# Altium integrated library WE-RJ45_LAN_rev16b.intlib: 51 symbols (continued)
## 7499110123 (continued)
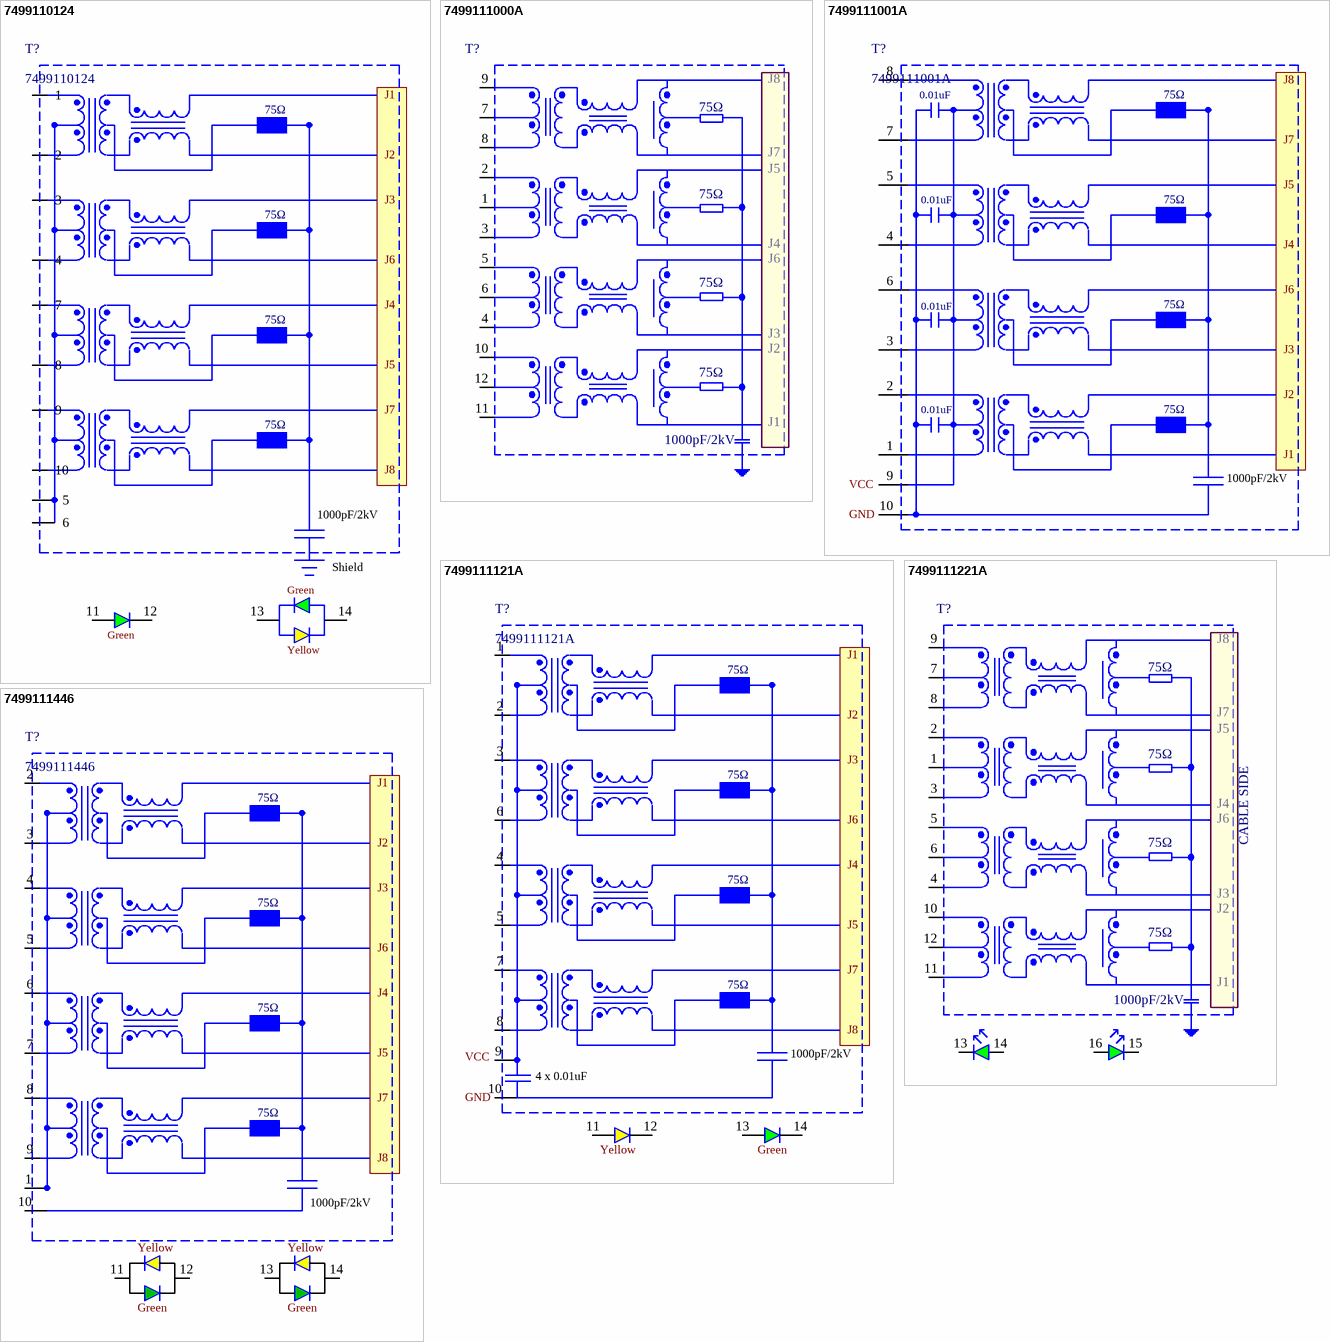
[diagram p4: symbols 7499110124 to 7499111446]
text: 1 CT:1 CT; J1; 75Ω; J2; J3; J6; J4; J5; J7; J8; 0.1 uF; 1000pF/2kV; Shield; Green; Yellow

## 7499110124
designator T?
RJ45 LAN Transformer, 10/100/1000 Base-T; Manufacturer: Wurth Elektronik; ComponentLink1 Description: Manufacturer; ComponentLink2 Description: Datasheet; ComponentLink1 URL: http://www.we-online.com; ComponentLink2 URL: http://katalog.we-online.de/pbs/datasheet/7499110124.pdf; Created By: Baojun Chen; Created Date: 14-Aug-15; PartNo: 7499110124
footprint 7499110124 (RJ45 LAN Transformer, 10/100/1000 Base-T)
pins: 1, 2, 3, 4, 5, 6, 7, 8, 9, 10, 11, 12, 13, 14
text: J1; 75Ω; J2; J3; J6; J4; J5; J7; J8; 1000pF/2kV; Shield; Green; Yellow

## 7499111000A
designator T?  (value not drawn)
RJ45 LAN Transformer, 10/100/1000 Base-T; Manufacturer: Wurth Elektronik; PartNo: 7499111000A; ComponentLink1Description: Manufacturer; ComponentLink1URL: http://www.we-online.de; Created by: Baojun Chen; Created Date: 14.Aug.2015; ComponentLink2Description: Datasheet; ComponentLink2URL: http://katalog.we-online.de/pbs/datasheet/7499111000A.pdf
footprint 7499111000A (RJ45 LAN Transformer, 10/100/1000 Base-T)
pins: 1, 2, 3, 4, 5, 6, 7, 8, 9, 10, 11, 12
text: J8; 75Ω; J7; J5; J4; J6; J3; J2; J1; 1000pF/2kV

## 7499111001A
designator T?
RJ45 LAN Transformer, 10/100/1000 Base-T; Manufacturer: Wurth Elektronik; ComponentLink1 Description: Manufacturer; ComponentLink2 Description: Datasheet; ComponentLink1 URL: http://www.we-online.com; ComponentLink2 URL: http://katalog.we-online.de/pbs/datasheet/7499111001A.pdf; Created By: Baojun Chen; Created Date: 15-Aug-15; PartNo: 7499111001A
footprint 7499111001A (RJ45 LAN Transformer, 10/100/1000 Base-T)
pins: 1, 2, 3, 4, 5, 6, 7, 8, 9, 10
text: J8; 0.01uF; 75Ω; J7; J5; J4; J6; J3; J2; J1; 1000pF/2kV; VCC; GND

## 7499111121A
designator T?
RJ45 LAN Transformer, 10/100/1000 Base-T; Manufacturer: Wurth Elektronik; ComponentLink1 Description: Manufacturer; ComponentLink2 Description: Datasheet; ComponentLink1 URL: http://www.we-online.com; ComponentLink2 URL: http://katalog.we-online.de/pbs/datasheet/7499111121A.pdf; Created By: Baojun Chen; Created Date: 14-Aug-15; PartNo: 7499111121A
footprint 7499111121A (RJ45 LAN Transformer, 10/100/1000 Base-T)
pins: 1, 2, 3, 4, 5, 6, 7, 8, 9, 10, 11, 12, 13, 14
text: J1; 75Ω; J2; J3; J6; J4; J5; J7; J8; 1000pF/2kV; VCC; 4 x 0.01uF; GND; Yellow; Green

## 7499111221A
designator T?
RJ45 LAN Transformer, 10/100/1000 Base-T; PartNo: 7499111221A; Manufacturer: Wurth Elektronik; E-mail: libraries@we-online.com; ComponentLink1Description: Manufacturer; ComponentLink1URL: http://www.we-online.de; Created by: Karrer Zheng; Created Date: May 2015; ComponentLink2Description: Datasheet; ComponentLink2URL: http://www.we-online.de/katalog/media/pdf/7499111221A.pdf
footprint 7499111221A
pins: 1, 2, 3, 4, 5, 6, 7, 8, 9, 10, 11, 12, 13 K, 14 A, 15 K, 16 A
text: J8; 75Ω; J7; J5; J4; J6; CABLE SIDE; J3; J2; J1; 1000pF/2kV

## 7499111446
designator T?
RJ45 LAN Transformer, 10/100/1000 Base-T; Manufacturer: Wurth Elektronik; ComponentLink1 Description: Manufacturer; ComponentLink2 Description: Datasheet; ComponentLink1 URL: http://www.we-online.com; ComponentLink2 URL: http://katalog.we-online.de/pbs/datasheet/7499111446.pdf; Created By: Baojun Chen; Created Date: 14-Aug-15; PartNo: 7499111446
footprint 7499111446 (RJ45 LAN Transformer, 10/100/1000 Base-T)
pins: 1, 2, 3, 4, 5, 6, 7, 8, 9, 10, 11, 12, 13, 14
text: J1; 75Ω; J2; J3; J6; J4; J5; J7; J8; 1000pF/2kV; Yellow; Green

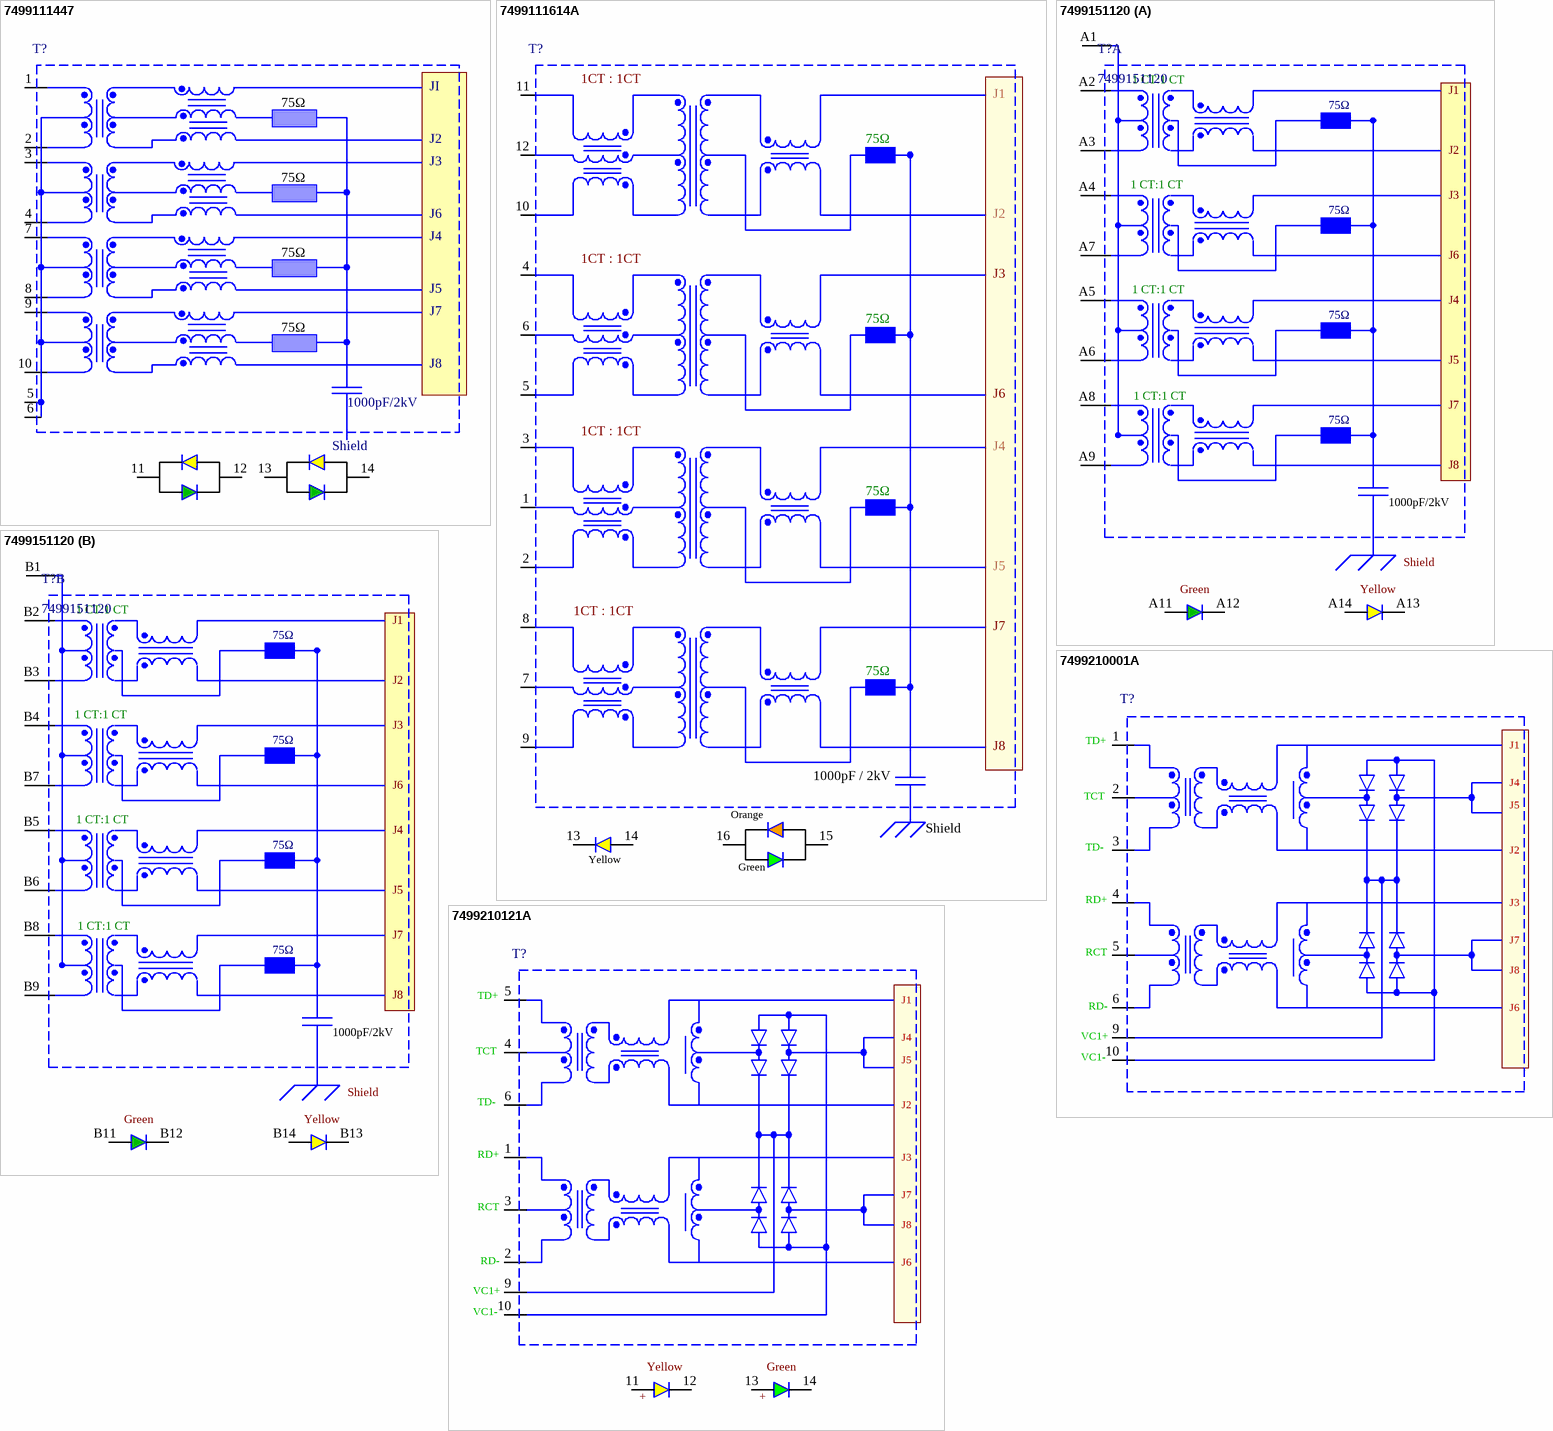
[diagram p5: symbols 7499111447 to 7499210121A]

## 7499111447
designator T?  (value not drawn)
RJ45 LAN Transformer, 10/100/1000 Base-T; Manufacturer: Wurth Elektronik; PartNo: 7499111447; ComponentLink1Description: Manufacturer; ComponentLink1URL: http://www.we-online.de; Created by: Baojun Chen; Created Date: Aug. 2015; ComponentLink2Description: Datasheet; ComponentLink2URL: http://katalog.we-online.de/pbs/datasheet/7499111447.pdf
footprint 7499111447 (RJ45 LAN Transformer 10/100/1000 Base-T)
pins: 1, 2, 3, 4, 5, 6, 7, 8, 9, 10, 11, 12, 13, 14
text: JI; 75Ω; J2; J3; J6; J4; J5; J7; J8; 1000pF/2kV; Shield

## 7499111614A
designator T?  (value not drawn)
RJ45 LAN Transformer, 10/100/1000 Base-T High Performance Low EMI; Manufacturer: Wurth Elektronik; PartNo: 7499111614A; ComponentLink1Description: Manufacturer; ComponentLink1URL: http://www.we-online.de; Created by: Baojun Chen; Created Date: 15.Aug.2015; ComponentLink2Description: Datasheet; ComponentLink2URL: http://katalog.we-online.de/pbs/datasheet/7499111614A.pdf
footprint 7499111614A (RJ45 LAN Transformer, 10/100/1000 Base-T High Performance Low EMI)
pins: 1, 2, 3, 4, 5, 6, 7, 8, 9, 10, 11, 12, 13, 14, 15, 16
text: 1CT : 1CT; J1; 75Ω; J2; J3; J6; J4; J5; J7; J8; 1000pF / 2kV; Orange; Shield; Yellow; Green

## 7499151120
designator T?
RJ45 LAN Transformer, 10/100/1000 Base-T Multiport & USB; Manufacturer: Wurth Elektronik; ComponentLink1 Description: Manufacturer; ComponentLink2 Description: Datasheet; ComponentLink1 URL: http://www.we-online.com; ComponentLink2 URL: http://katalog.we-online.de/pbs/datasheet/7499151120.pdf; Created By: Baojun Chen; Created Date: 18-Aug-15; PartNo: 7499151120
footprint 7499151120 (RJ45 LAN Transformer, 10/100/1000 Base-T Multiport & USB)
part A pins: A1, A2, A3, A4, A5, A6, A7, A8, A9, A11, A12, A13, A14
part B pins: B1, B2, B3, B4, B5, B6, B7, B8, B9, B11, B12, B13, B14
1 alternate drawing of the same symbol
part A text: 1 CT:1 CT; J1; 75Ω; J2; J3; J6; J4; J5; J7; J8; 1000pF/2kV; Shield; Green; Yellow
part B text: 1 CT:1 CT; J1; 75Ω; J2; J3; J6; J4; J5; J7; J8; 1000pF/2kV; Shield; Green; Yellow

## 7499210001A
designator T?  (value not drawn)
RJ45 LAN Transformer, 10/100/1000 Base-T PoE/PoE+; Manufacturer: Wurth Elektronik; PartNo: 7499210001A; ComponentLink1Description: Manufacturer; ComponentLink1URL: http://www.we-online.de; Created by: Baojun Chen; Created Date: 17.Aug.2015; ComponentLink2Description: Datasheet; ComponentLink2URL: http://katalog.we-online.de/pbs/datasheet/7499210001A.pdf
footprint 7499210001A (RJ45 LAN Transformer, 10/100/1000 Base-T PoE/PoE+)
pins: 1 TD+, 2 TCT, 3 TD-, 4 RD+, 5 RCT, 6 RD-, 9 VC1+, 10 VC1-
text: J1; J4; J5; J2; J3; J7; J8; J6

## 7499210121A
designator T?  (value not drawn)
RJ45 LAN Transformer, 10/100/1000 Base-T PoE/PoE+; Manufacturer: Wurth Elektronik; PartNo: 7499210121A; ComponentLink1Description: Manufacturer; ComponentLink1URL: http://www.we-online.de; Created by: Baojun Chen; Created Date: 17.Aug.2015; ComponentLink2Description: Datasheet; ComponentLink2URL: http://katalog.we-online.de/pbs/datasheet/7499210121A.pdf
footprint 7499210121A (RJ45 LAN Transformer, 10/100/1000 Base-T PoE/PoE+)
pins: 1 RD+, 2 RD-, 3 RCT, 4 TCT, 5 TD+, 6 TD-, 9 VC1+, 10 VC1-, 11, 12, 13, 14
text: J1; J4; J5; J2; J3; J7; J8; J6; Yellow; Green; +

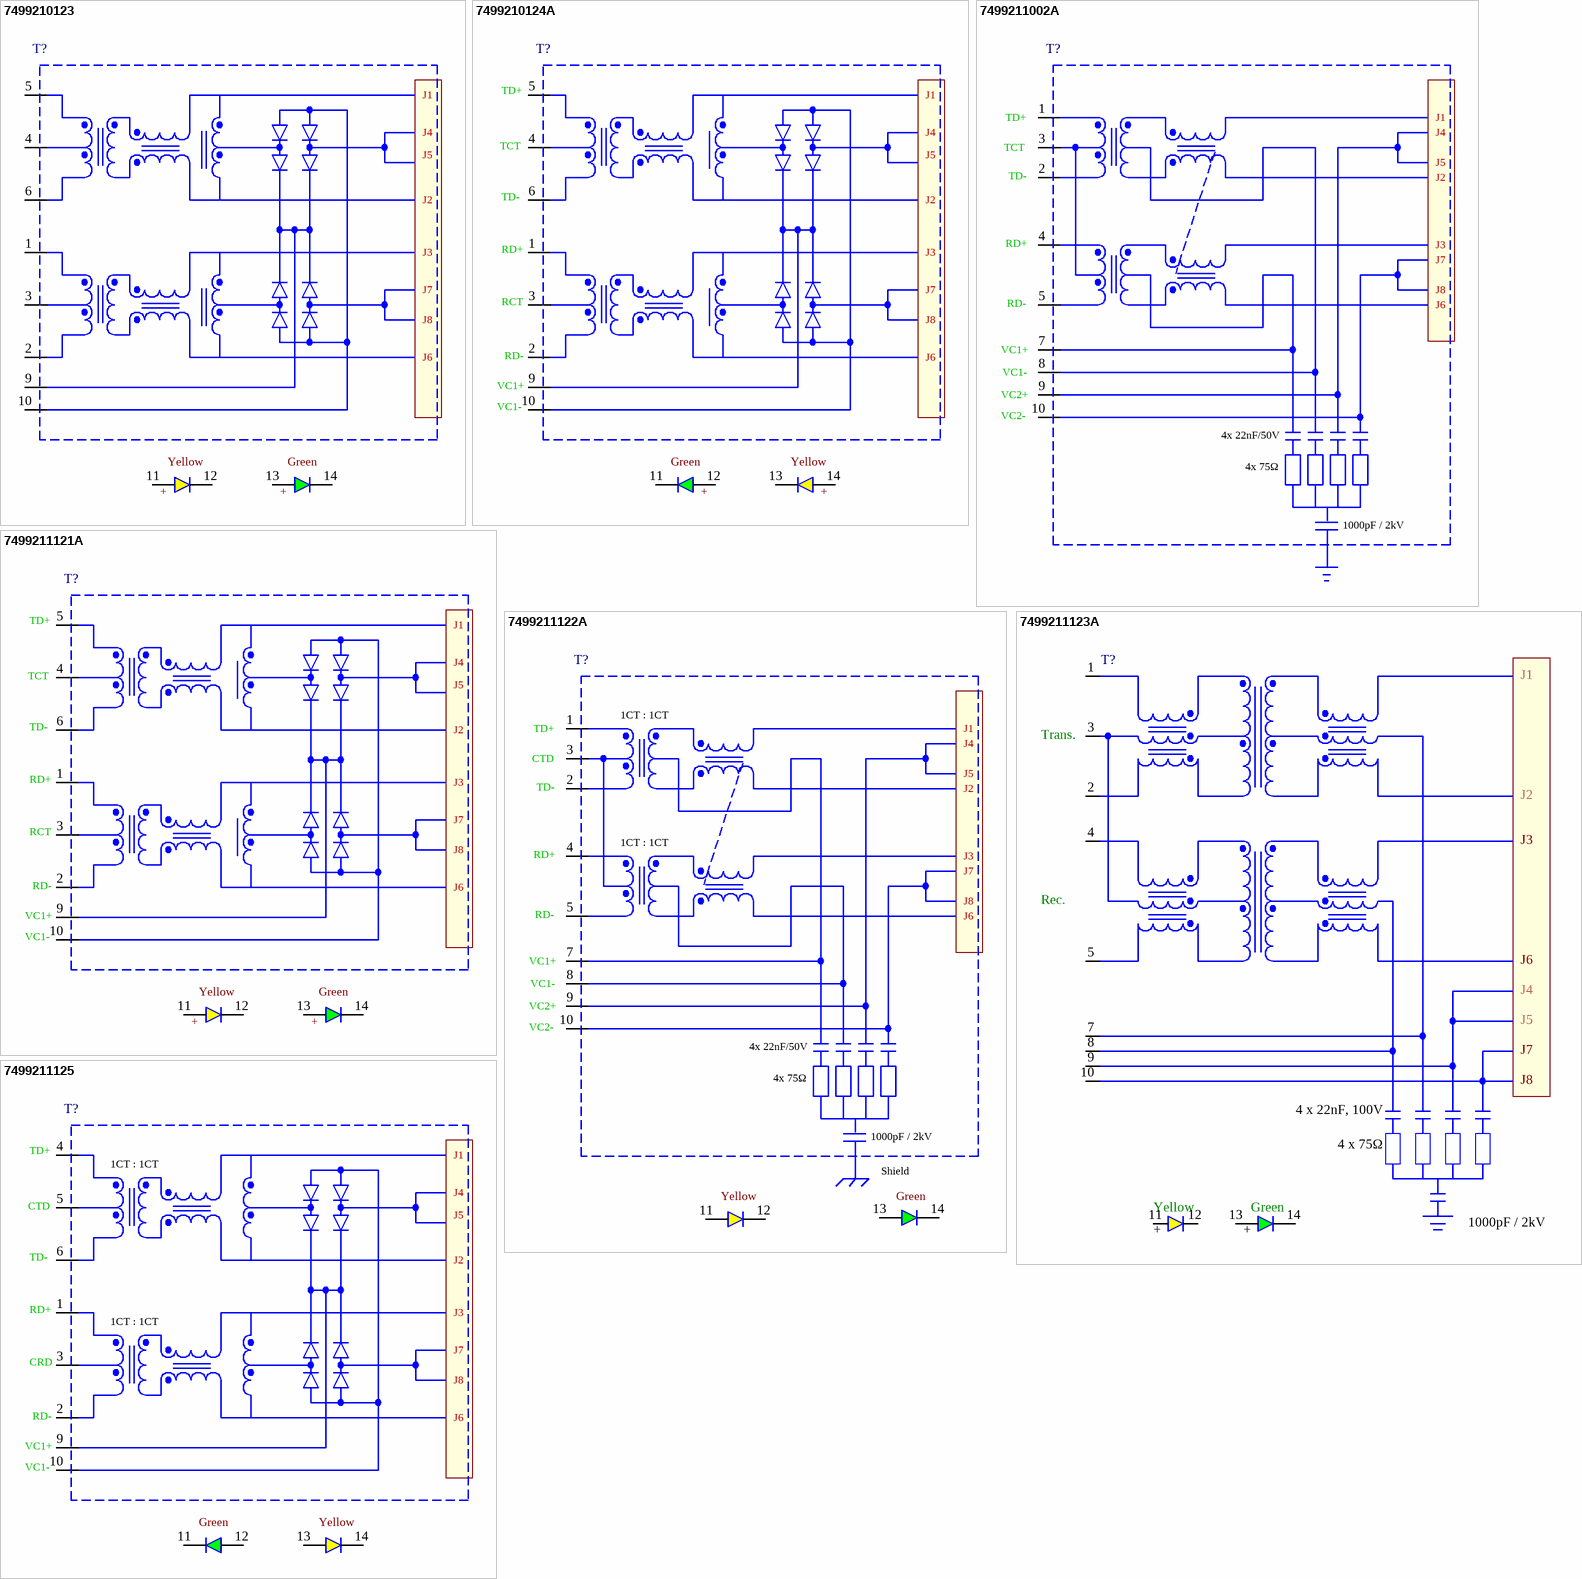
[diagram p6: symbols 7499210123 to 7499211125]

## 7499210123
designator T?  (value not drawn)
RJ45 LAN Transformer, 10/100/1000 Base-T PoE/PoE+; Manufacturer: Wurth Elektronik; PartNo: 7499210123; ComponentLink1Description: Manufacturer; ComponentLink1URL: http://www.we-online.de; Created by: Baojun Chen; Created Date: 17.Aug.2015; ComponentLink2Description: Datasheet; ComponentLink2URL: http://katalog.we-online.de/pbs/datasheet/7499210123.pdf
footprint 7499210123 (RJ45 LAN Transformer, 10/100/1000 Base-T PoE/PoE+)
pins: 1, 2, 3, 4, 5, 6, 9, 10, 11, 12, 13, 14
text: J1; J4; J5; J2; J3; J7; J8; J6; Yellow; Green; +

## 7499210124A
designator T?  (value not drawn)
RJ45 LAN Transformer, 10/100/1000 Base-T PoE/PoE+; Manufacturer: Wurth Elektronik; PartNo: 7499210124A; ComponentLink1Description: Manufacturer; ComponentLink1URL: http://www.we-online.de; Created by: Baojun Chen; Created Date: 17.Aug.2015; ComponentLink2Description: Datasheet; ComponentLink2URL: http://katalog.we-online.de/pbs/datasheet/7499210124A.pdf
footprint 7499210124A (RJ45 LAN Transformer, 10/100/1000 Base-T PoE/PoE+)
pins: 1 RD+, 2 RD-, 3 RCT, 4 TCT, 5 TD+, 6 TD-, 9 VC1+, 10 VC1-, 11, 12, 13, 14
text: J1; J4; J5; J2; J3; J7; J8; J6; Green; Yellow; +

## 7499211002A
designator T?  (value not drawn)
RJ45 LAN Transformer, 10/100/1000 Base-T PoE/PoE+; Manufacturer: Wurth Elektronik; PartNo: 7499211002A; ComponentLink1Description: Manufacturer; ComponentLink1URL: http://www.we-online.de; Created by: Baojun Chen; Created Date: 17.Aug.2015; ComponentLink2Description: Datasheet; ComponentLink2URL: http://katalog.we-online.de/pbs/datasheet/7499211002A.pdf
footprint 7499211002A (RJ45 LAN Transformer, 10/100/1000 Base-T PoE/PoE+)
pins: 1 TD+, 2 TD-, 3 TCT, 4 RD+, 5 RD-, 7 VC1-, 8 VC1-, 9 VC2+, 10 VC2-
text: J1; J4; J5; J2; J3; J7; J8; J6; VC1+; 4x 22nF/50V; 4x 75Ω; 1000pF / 2kV

## 7499211121A
designator T?  (value not drawn)
RJ45 LAN Transformer, 10/100/1000 Base-T PoE/PoE+; Manufacturer: Wurth Elektronik; PartNo: 7499211121A; ComponentLink1Description: Manufacturer; ComponentLink1URL: http://www.we-online.de; Created by: Baojun Chen; Created Date: 17.Aug.2015; ComponentLink2Description: Datasheet; ComponentLink2URL: http://katalog.we-online.de/pbs/datasheet/7499211121A.pdf
footprint 7499211121A (RJ45 LAN Transformer, 10/100/1000 Base-T PoE/PoE+)
pins: 1 RD+, 2 RD-, 3 RCT, 4 TCT, 5 TD+, 6 TD-, 9 VC1+, 10 VC1-, 11, 12, 13, 14
text: J1; J4; J5; J2; J3; J7; J8; J6; Yellow; Green; +

## 7499211122A
designator T?  (value not drawn)
RJ45 LAN Transformer, 10/100/1000 Base-T PoE/PoE+; Manufacturer: Wurth Elektronik; PartNo: 7499211122A; ComponentLink1Description: Manufacturer; ComponentLink1URL: http://www.we-online.de; Created by: Baojun Chen; Created Date: 17.Aug.2015; ComponentLink2Description: Datasheet; ComponentLink2URL: http://katalog.we-online.de/pbs/datasheet/7499211122A.pdf
footprint 7499211122A (RJ45 LAN Transformer, 10/100/1000 Base-T PoE/PoE+)
pins: 1 TD+, 2 TD-, 3 CTD, 4 RD+, 5 RD-, 7 VC1-, 8 VC1-, 9 VC2+, 10 VC2-, 11, 12, 13, 14
text: 1CT : 1CT; J1; J4; J5; J2; J3; J7; J8; J6; VC1+; 4x 22nF/50V; 4x 75Ω; 1000pF / 2kV; Shield; Yellow; Green

## 7499211123A
designator T?  (value not drawn)
RJ45 LAN Transformer, 10/100/1000 Base-T High Performance Low EMI; Manufacturer: Wurth Elektronik; PartNo: 7499211123A; ComponentLink1Description: Manufacturer; ComponentLink1URL: http://www.we-online.de; Created by: Baojun Chen; Created Date: 15.Aug.2015; ComponentLink2Description: Datasheet; ComponentLink2URL: http://katalog.we-online.de/pbs/datasheet/7499211123A.pdf
footprint 7499211123A (RJ45 LAN Transformer, 10/100/1000 Base-T High Performance Low EMI)
pins: 1, 2, 3, 4, 5, 7, 8, 9, 10, 11, 12, 13, 14
text: J1; Trans.; J2; J3; Rec.; J6; J4; J5; J7; J8; 4 x 22nF, 100V; 4 x 75Ω; Yellow; Green; 1000pF / 2kV; +

## 7499211125
designator T?  (value not drawn)
RJ45 LAN Transformer, 10/100/1000 Base-T PoE/PoE+; Manufacturer: Wurth Elektronik; PartNo: 7499211125; ComponentLink1Description: Manufacturer; ComponentLink1URL: http://www.we-online.de; Created by: Baojun Chen; Created Date: 17.Aug.2015; ComponentLink2Description: Datasheet; ComponentLink2URL: http://katalog.we-online.de/pbs/datasheet/7499211125.pdf
footprint 7499211125 (RJ45 LAN Transformer, 10/100/1000 Base-T PoE/PoE+)
pins: 1 RD+, 2 RD-, 3 CRD, 4 TD+, 5 CTD, 6 TD-, 9 VC1+, 10 VC1-, 11, 12, 13, 14
text: J1; 1CT : 1CT; J4; J5; J2; J3; J7; J8; J6; Green; Yellow

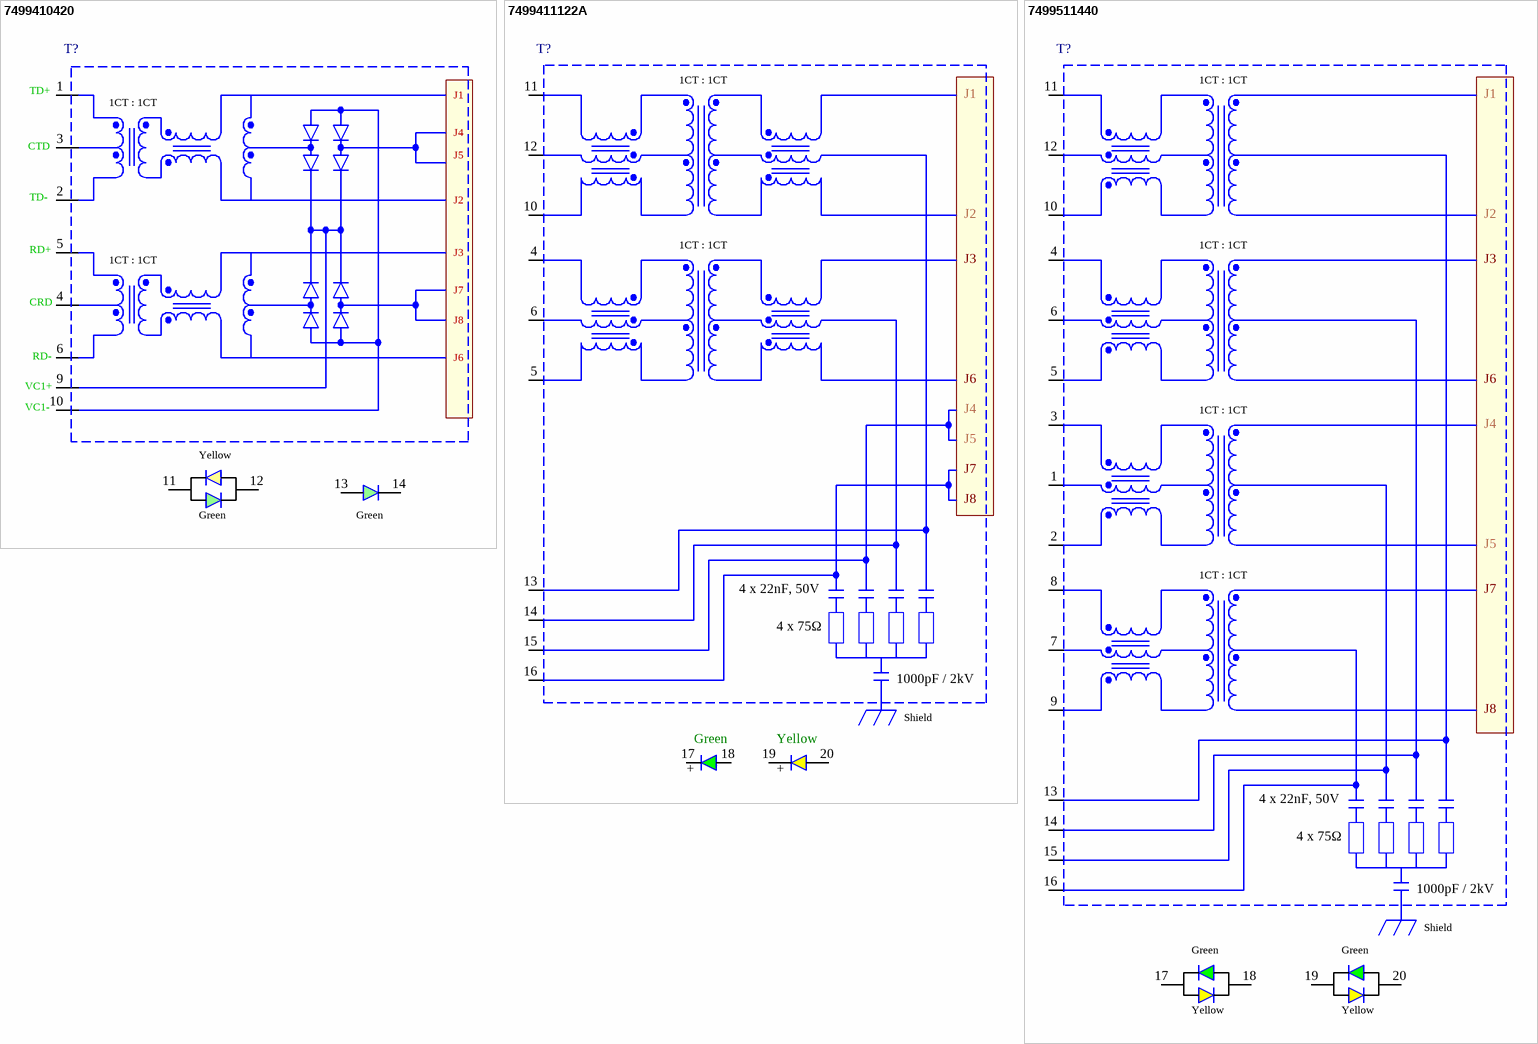
[diagram p7: symbols 7499410420 to 7499511440]

## 7499410420
designator T?  (value not drawn)
RJ45 LAN Transformer, 10/100/1000 Base-T PoE/PoE+; Manufacturer: Wurth Elektronik; PartNo: 7499410420; ComponentLink1Description: Manufacturer; ComponentLink1URL: http://www.we-online.de; Created by: Baojun Chen; Created Date: 17.Aug.2015; ComponentLink2Description: Datasheet; ComponentLink2URL: http://katalog.we-online.de/pbs/datasheet/7499410420.pdf
footprint 7499410420 (RJ45 LAN Transformer, 10/100/1000 Base-T PoE/PoE+)
pins: 1 TD+, 2 TD-, 3 CTD, 4 CRD, 5 RD+, 6 RD-, 9 VC1+, 10 VC1-, 11, 12, 13, 14
text: J1; 1CT : 1CT; J4; J5; J2; J3; J7; J8; J6; Yellow; Green

## 7499411122A
designator T?  (value not drawn)
RJ45 LAN Transformer, 10/100/1000 Base-T High Performance Low EMI; Manufacturer: Wurth Elektronik; PartNo: 7499411122A; ComponentLink1Description: Manufacturer; ComponentLink1URL: http://www.we-online.de; Created by: Baojun Chen; Created Date: 17.Aug.2015; ComponentLink2Description: Datasheet; ComponentLink2URL: http://katalog.we-online.de/pbs/datasheet/7499411122A.pdf
footprint 7499411122A (RJ45 LAN Transformer, 10/100/1000 Base-T High Performance Low EMI)
pins: 4, 5, 6, 10, 11, 12, 13, 14, 15, 16, 17, 18, 19, 20
text: 1CT : 1CT; J1; J2; J3; J6; J4; J5; J7; J8; 4 x 22nF, 50V; 4 x 75Ω; 1000pF / 2kV; Shield; Green; Yellow; +

## 7499511440
designator T?  (value not drawn)
RJ45 LAN Transformer, 10/100/1000 Base-T PoE/PoE+; Manufacturer: Wurth Elektronik; PartNo: 7499511440; ComponentLink1Description: Manufacturer; ComponentLink1URL: http://www.we-online.de; Created by: Baojun Chen; Created Date: 17.Aug.2015; ComponentLink2Description: Datasheet; ComponentLink2URL: http://katalog.we-online.de/pbs/datasheet/7499511440.pdf
footprint 7499511440 (RJ45 LAN Transformer, 10/100/1000 Base-T PoE/PoE+)
pins: 1, 2, 3, 4, 5, 6, 7, 8, 9, 10, 11, 12, 13, 14, 15, 16, 17, 18, 19, 20
text: 1CT : 1CT; J1; J2; J3; J6; J4; J5; J7; J8; 4 x 22nF, 50V; 4 x 75Ω; 1000pF / 2kV; Shield; Green; Yellow

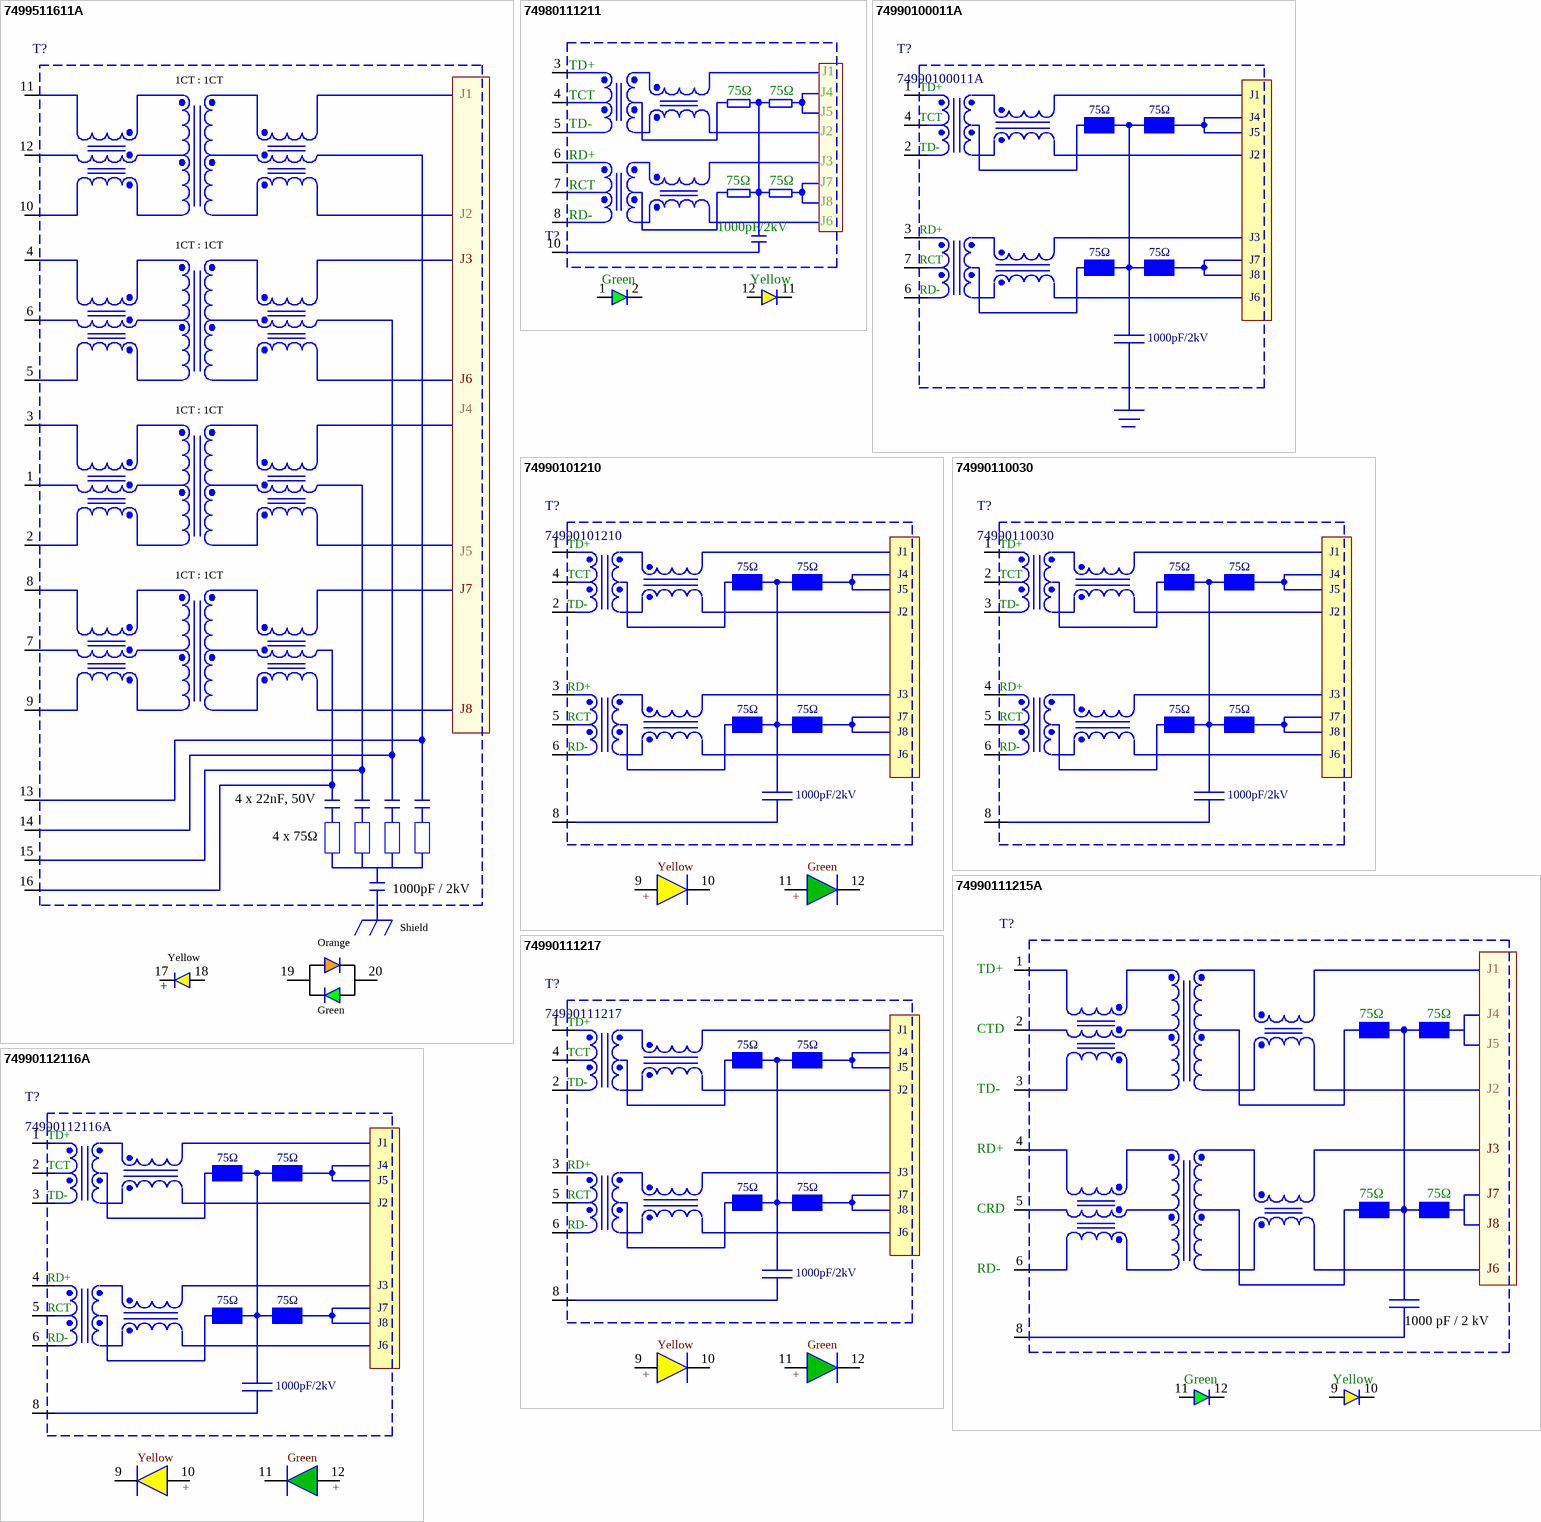
[diagram p8: symbols 7499511611A to 74990112116A]

## 7499511611A
designator T?  (value not drawn)
RJ45 LAN Transformer, 10/100/1000 Base-T High Performance Low EMI; Manufacturer: Wurth Elektronik; PartNo: 7499511611A; ComponentLink1Description: Manufacturer; ComponentLink1URL: http://www.we-online.de; Created by: Baojun Chen; Created Date: 17.Aug.2015; ComponentLink2Description: Datasheet; ComponentLink2URL: http://katalog.we-online.de/pbs/datasheet/7499511611A.pdf
footprint 7499511611A (RJ45 LAN Transformer, 10/100/1000 Base-T High Performance Low EMI)
pins: 1, 2, 3, 4, 5, 6, 7, 8, 9, 10, 11, 12, 13, 14, 15, 16, 17, 18, 19, 20
text: 1CT : 1CT; J1; J2; J3; J6; J4; J5; J7; J8; 4 x 22nF, 50V; 4 x 75Ω; 1000pF / 2kV; Shield; Orange; Yellow; +; Green

## 74980111211
designator T?
RJ45 LAN Transformer, 10/100/1000 Base-T SMD; PartNo: 74980111211; Manufacturer: Wurth Elektronik; E-mail: libraries@we-online.com; ComponentLink1Description: Manufacturer; ComponentLink1URL: http://www.we-online.de; Created by: Karrer Zheng; Created Date: Feb 2015; ComponentLink2Description: Datasheet; ComponentLink2URL: http://www.we-online.de/katalog/media/pdf/74980111211.pdf
footprint 74980111211 (10/100Base-T, SMD, 1x1, Tab up, with shield tabs, LED L-R yellow-green; ETR)
pins: 1 +, 2 -, 3 RD+, 4 RCT, 5 RD-, 6 TD+, 7 TCT, 8 TD-, 10 SH, 11 -, 12 +
text: J1; 75Ω; J4; J5; J2; J3; J7; J8; J6; 1000pF/2kV; Green; Yellow

## 74990100011A
designator T?
RJ45 LAN Transformer, 10/100 Base-T; Manufacturer: Wurth Elektronik; ComponentLink1 Description: Manufacturer; ComponentLink2 Description: Datasheet; ComponentLink1 URL: http://www.we-online.com; ComponentLink2 URL: http://katalog.we-online.de/pbs/datasheet/74990100011A.pdf; Created By: Baojun Chen; Created Date: 14-Aug-15; PartNo: 74990100011A
footprint 74990100011A (RJ45 LAN Transformer, 10/100 Base-T)
pins: 1 TD+, 2 TCT, 3 TD-, 4 RD+, 6 RD-, 7
text: J1; 75Ω; J4; J5; J2; J3; RCT; J7; J8; J6; 1000pF/2kV

## 74990101210
designator T?
RJ45 LAN Transformer, 10/100 Base-T; Manufacturer: Wurth Elektronik; ComponentLink1 Description: Manufacturer; ComponentLink2 Description: Datasheet; ComponentLink1 URL: http://www.we-online.com; ComponentLink2 URL: http://katalog.we-online.de/pbs/datasheet/74990101210.pdf; Created By: Baojun Chen; Created Date: 14-Aug-15; PartNo: 74990101210
footprint 74990101210 (RJ45 LAN Transformer, 10/100 Base-T)
pins: 1 TD+, 2 TCT, 3 TD-, 4 RD+, 5 RCT, 6 RD-, 8, 9, 10, 11, 12
text: J1; 75Ω; J4; J5; J2; J3; J7; J8; J6; 1000pF/2kV; Yellow; Green; +

## 74990110030
designator T?
RJ45 LAN Transformer, 10/100 Base-T; Manufacturer: Wurth Elektronik; ComponentLink1 Description: Manufacturer; ComponentLink2 Description: Datasheet; ComponentLink1 URL: http://www.we-online.com; ComponentLink2 URL: http://katalog.we-online.de/pbs/datasheet/74990110030.pdf; Created By: Baojun Chen; Created Date: 13-Aug-15; PartNo: 74990110030
footprint 74990110030 (RJ45 LAN Transformer, 10/100 Base-T)
pins: 1 TD+, 2 TCT, 3 TD-, 4 RD+, 5 RCT, 6 RD-, 8
text: J1; 75Ω; J4; J5; J2; J3; J7; J8; J6; 1000pF/2kV

## 74990111215A
designator T?  (value not drawn)
RJ45 LAN Transformer, 10/100/1000 Base-T High Performance Low EMI; Manufacturer: Wurth Elektronik; PartNo: 74990111215A; ComponentLink1Description: Manufacturer; ComponentLink1URL: http://www.we-online.de; Created by: Baojun Chen; Created Date: 15.Aug.2015; ComponentLink2Description: Datasheet; ComponentLink2URL: http://katalog.we-online.de/pbs/datasheet/74990111215A.pdf
footprint 74990111215A (RJ45 LAN Transformer, 10/100/1000 Base-T High Performance Low EMI)
pins: 1 TD+, 2 CTD, 3 TD-, 4 RD+, 5 CRD, 6 RD-, 8, 9, 10, 11, 12
text: J1; 75Ω; J4; J5; J2; J3; J7; J8; J6; 1000 pF / 2 kV; Green; Yellow

## 74990111217
designator T?
RJ45 LAN Transformer, 10/100 Base-T; Manufacturer: Wurth Elektronik; ComponentLink1 Description: Manufacturer; ComponentLink2 Description: Datasheet; ComponentLink1 URL: http://www.we-online.com; ComponentLink2 URL: http://katalog.we-online.de/pbs/datasheet/74990111217.pdf; Created By: Baojun Chen; Created Date: 14-Aug-15; PartNo: 74990111217
footprint 74990111217 (RJ45 LAN Transformer, 10/100 Base-T)
pins: 1 TD+, 2 TCT, 3 TD-, 4 RD+, 5 RCT, 6 RD-, 8, 9, 10, 11, 12
text: J1; 75Ω; J4; J5; J2; J3; J7; J8; J6; 1000pF/2kV; Yellow; Green; +

## 74990112116A
designator T?
RJ45 LAN Transformer, 10/100 Base-T; Manufacturer: Wurth Elektronik; ComponentLink1 Description: Manufacturer; ComponentLink2 Description: Datasheet; ComponentLink1 URL: http://www.we-online.com; ComponentLink2 URL: http://katalog.we-online.de/pbs/datasheet/74990112116A.pdf; Created By: Baojun Chen; Created Date: 13-Aug-15; PartNo: 74990112116A
footprint 74990112116A (RJ45 LAN Transformer, 10/100 Base-T)
pins: 1 TD+, 2 TCT, 3 TD-, 4 RD+, 5 RCT, 6 RD-, 8, 9, 10, 11, 12
text: J1; 75Ω; J4; J5; J2; J3; J7; J8; J6; 1000pF/2kV; Yellow; Green; +